# Altium footprint library connector.PcbLib: 189 footprints (part 1 of 12)
Each footprint in its own frame and in the unit in brackets; x right, y up, seen from the top. Pads: shape width x height; smd on the part's side, far side on the other; paste and mask are expansions set on the pad; w line width, h text height; cw(c..) or ccw(c..) is an arc to the next point about the centre after c.
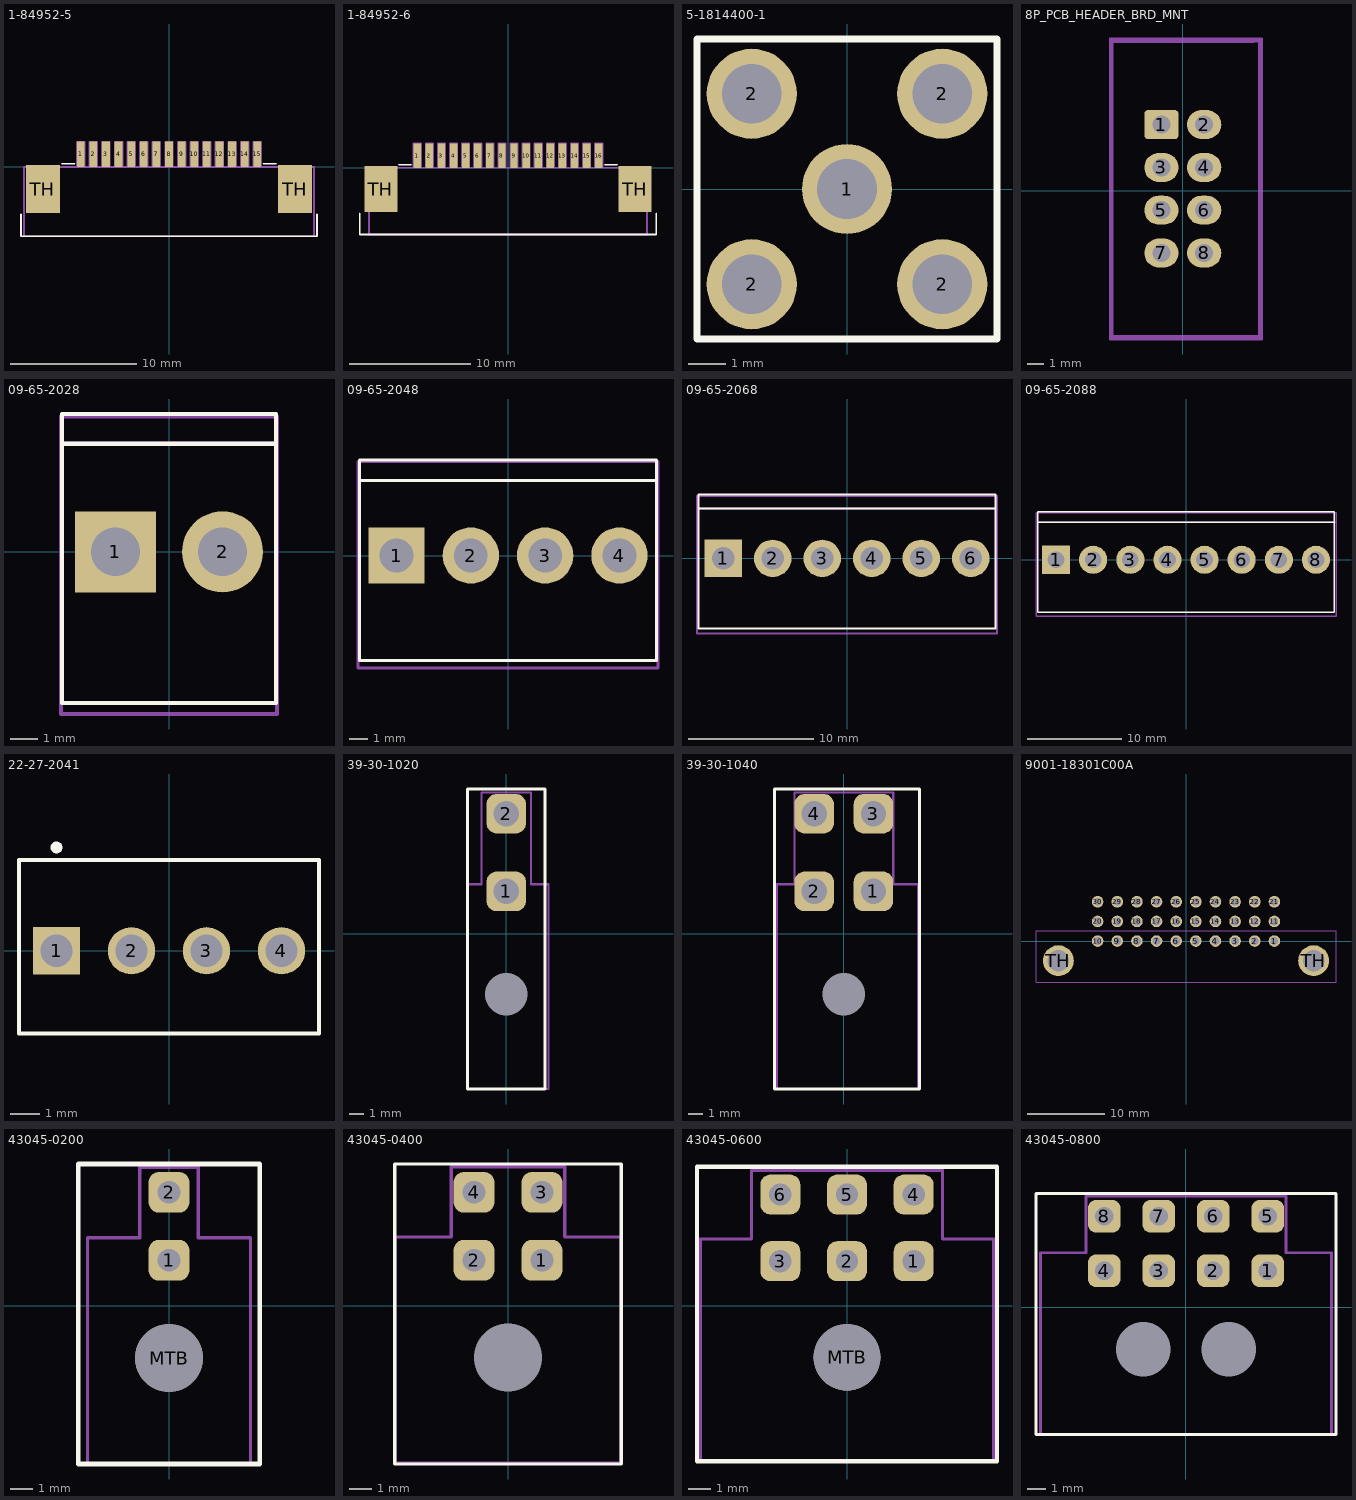
[diagram p0: the footprints below, top view; thin cyan lines are the x and y axes]

## 1-84952-5 [mm]
height 2.6
pads (17):
  rect 0.61x2 smd: 1(-7,1) 2(-6,1) 3(-5,1) 4(-4,1) 5(-3,1) 6(-2,1) 7(-1,1) 8(0,1) 9(1,1) 10(2,1) 11(3,1) 12(4,1) 13(5,1) 14(6,1) 15(7,1)
  rect 2.7x3.8 smd: TH(-10,-1.75) TH(10,-1.75)
Top Overlay:
  lines w0.15: -11.75,-3.75 -11.75,-5.5 0.5,-5.5 11.75,-5.5 11.75,-3.75 ; -8.5,0.25 -7.5,0.25 ; 7.5,0.25 8.5,0.25
Mechanical 29:
  lines w0.15: -7.3,0 -7.3,2 -6.7,2 -6.7,0 ; -6.3,0 -6.3,2 -5.7,2 -5.7,0 ; -5.3,0 -5.3,2 -4.7,2 -4.7,0 ; -4.3,0 -4.3,2 -3.7,2 -3.7,0 ; -3.3,0 -3.3,2 -2.7,2 -2.7,0 ; -2.3,0 -2.3,2 -1.7,2 -1.7,0 ; -1.3,0 -1.3,2 -0.7,2 -0.7,0 ; -0.3,0 -0.3,2 0.3,2 0.3,0 ; 0.7,0 0.7,2 1.3,2 1.3,0 ; 1.7,0 1.7,2 2.3,2 2.3,0 ; 2.7,0 2.7,2 3.3,2 3.3,0 ; 3.7,0 3.7,2 4.3,2 4.3,0 ; 4.7,0 4.7,2 5.3,2 5.3,0 ; 5.7,0 5.7,2 6.3,2 6.3,0 ; 6.7,0 6.7,2 7.3,2 7.3,0 ; -11.5,-5.5 11.5,-5.5 11.5,0 -11.5,0 -11.5,-5.5
  text ".Designator" at -3,-2.3 h1

## 1-84952-6 [mm]
height 2.6
pads (18):
  rect 0.61x2 smd: 1(-7.5,1) 2(-6.5,1) 3(-5.5,1) 4(-4.5,1) 5(-3.5,1) 6(-2.5,1) 7(-1.5,1) 8(-0.5,1) 9(0.5,1) 10(1.5,1) 11(2.5,1) 12(3.5,1) 13(4.5,1) 14(5.5,1) 15(6.5,1) 16(7.5,1)
  rect 2.7x3.8 smd: TH(-10.5,-1.75) TH(10.5,-1.75)
Top Overlay:
  lines w0.15: -12.25,-3.75 -12.25,-5.5 0.5,-5.5 12.25,-5.5 12.25,-3.75 ; -9,0.25 -8,0.25 ; 8,0.25 9,0.25
Mechanical 29:
  lines w0.15: -7.8,0 -7.8,2 -7.2,2 -7.2,0 ; -6.8,0 -6.8,2 -6.2,2 -6.2,0 ; -5.8,0 -5.8,2 -5.2,2 -5.2,0 ; -4.8,0 -4.8,2 -4.2,2 -4.2,0 ; -3.8,0 -3.8,2 -3.2,2 -3.2,0 ; -2.8,0 -2.8,2 -2.2,2 -2.2,0 ; -1.8,0 -1.8,2 -1.2,2 -1.2,0 ; -0.8,0 -0.8,2 -0.2,2 -0.2,0 ; 0.2,0 0.2,2 0.8,2 0.8,0 ; 1.2,0 1.2,2 1.8,2 1.8,0 ; 2.2,0 2.2,2 2.8,2 2.8,0 ; 3.2,0 3.2,2 3.8,2 3.8,0 ; 4.2,0 4.2,2 4.8,2 4.8,0 ; 5.2,0 5.2,2 5.8,2 5.8,0 ; 6.2,0 6.2,2 6.8,2 6.8,0 ; 7.2,0 7.2,2 7.8,2 7.8,0 ; -11.5,-5.5 -11.5,0 11.5,0 11.5,-5.5 -11.5,-5.5
  text ".Designator" at -2.5,-2.3 h1

## 5-1814400-1 [mm] "TE, SMA Connector Jack, Female Socket 50 Ohm Through Hole, Right Angle Solder"
height 10.43
pads (5):
  round 2.4 hole 1.6: 1(0,0) 2(-2.54,-2.54) 2(-2.54,2.54) 2(2.54,-2.54) 2(2.54,2.54)
Top Overlay:
  lines w0.2: -4,-4 4,-4 4,4 -4,4 -4,-4
3D body "c-5-1814400-1-d-3d.stp": height 10.43, standoff -3.1, extent -3.163,-11.05 3.164,3.15

## 8P_PCB_HEADER_BRD_MNT [mil] "HEADER BRD MNT 8POS 2.54MM"
height 393.7
pads (8):
  rrect25% 80x68 hole 42: 1(-50,155)
  oval 80x68 hole 42: 2(50,155) 3(-50,55) 4(50,55) 5(-50,-45) 6(50,-45) 7(-50,-145) 8(50,-145)
Mechanical 15:
  lines w5.91: -170,-346 -170,355 185,355 185,-346 -170,-346
Mechanical 29:
  circle w5.91: c-50,155 r21.83
  circle w5.91: c50,155 r21.83
  circle w5.91: c-50,55 r21.83
  circle w5.91: c50,55 r21.83
  circle w5.91: c50,-45 r21.83
  circle w5.91: c50,-145 r21.83
  circle w5.91: c-50,-145 r21.83
  circle w5.91: c-50,-45 r21.83
  circle w5.91: c-50,55 r21.83
  lines w5.91: -160,-340 165,-340 ; -160,349 165,349 ; -166.34,-339.57 179.13,-339.57 179.13,350.39 -166.34,350.39 -166.34,-339.57 ; -165,-340 -165,350 180,350 180,-340 -165,-340
  text ".Designator" at -118.11,263.78 h39.37
3D body "User Library-8 pin IDC shrouded header V2.step": height 361.42, standoff -116.93, extent -176.18,-344.09 186.02,355.91

## 09-65-2028 [mm]
pads (2):
  rect 3x3 hole 1.8: 1(-1.98,0)
  round 3 hole 1.8: 2(1.98,0)
Top Overlay:
  lines w0.15: -3.96,4 3.96,4 ; -3.96,-5.6 3.96,-5.6 3.96,5.1 -3.96,5.1 -3.96,-5.6
Mechanical 29:
  lines w0.15: -4,4 4,4 ; -4,-6 -4,5 4,5 4,-6 -4,-6
  text ".Designator" at -3.5,-0.3 h1
3D body "009652028.stp": height 13.85, standoff -3.6, extent -3.58,-5.6 3.58,5.15

## 09-65-2048 [mm]
height 12
pads (4):
  rect 3x3 hole 1.8: 1(-5.94,0)
  round 3 hole 1.8: 2(-1.98,0) 3(1.98,0) 4(5.94,0)
Top Overlay:
  lines w0.15: -7.92,4 7.92,4 ; -7.92,-5.6 7.92,-5.6 7.92,5.1 -7.92,5.1 -7.92,-5.6
Mechanical 29:
  lines w0.15: 8,4 -8,4 -8,5 ; -8,5 8,5 8,-6 -8,-6 -8,5
  text ".Designator" at -3.5,-0.8 h1
3D body "009652048.stp": height 13.85, standoff -3.6, extent -7.515,-5.6 7.565,5.15

## 09-65-2068 [mm]
pads (6):
  rect 3x3 hole 1.8: 1(-9.9,0)
  round 3 hole 1.8: 2(-5.94,0) 3(-1.98,0) 4(1.98,0) 5(5.94,0) 6(9.9,0)
Top Overlay:
  lines w0.15: -11.88,4 11.88,4 ; -11.88,-5.6 11.88,-5.6 11.88,5.1 -11.88,5.1 -11.88,-5.6
Mechanical 29:
  lines w0.15: 12,4 -12,4 -12,5 ; -12,5 12,5 12,-6 -12,-6 -12,5
  text ".Designator" at -3.5,-0.3 h1
3D body "009652068.stp": height 13.85, standoff -3.6, extent -11.5,-5.6 11.5,5.15

## 09-65-2088 [mm]
pads (8):
  rect 3x3 hole 1.8: 1(-13.86,0)
  round 3 hole 1.8: 2(-9.9,0) 3(-5.94,0) 4(-1.98,0) 5(1.98,0) 6(5.94,0) 7(9.9,0) 8(13.86,0)
Top Overlay:
  lines w0.15: -15.84,4 15.84,4 ; -15.84,-5.6 15.84,-5.6 15.84,5.1 -15.84,5.1 -15.84,-5.6
Mechanical 29:
  lines w0.15: 16,4 -16,4 -16,5 ; -16,5 16,5 16,-6 -16,-6 -16,5
  text ".Designator" at -2,0.2 h1
3D body "009652088.stp": height 13.85, standoff -3.6, extent -15.46,-5.6 15.46,5.15

## 22-27-2041 [mm]
pads (4):
  rect 1.6x1.6 hole 1.1: 1(-3.81,0)
  round 1.6 hole 1.1: 2(-1.27,0) 3(1.27,0) 4(3.81,0)
Top Overlay:
  circle w0.2: c-3.81,3.5 r0.1
  lines w0.15: -5.08,-2.8 5.08,-2.8 5.08,3.075 -5.08,3.075 -5.08,-2.8
3D body "022272041.stp": height 11.72, standoff -3.54, extent -5.105,-2.825 5.055,2.975

## 39-30-1020 [mm] "Mini-Fit Jr.� Header, Dual Row, Right Angle, with Snap-in Plastic Peg PCB Lock, 2 Circuits, PA Polyamide Nylon 6/6 94V-2, Tin (Sn) Plating"
height 9.6
pads (3):
  rrect50% 2.8x2.8 hole 1.8: 1(0,3) 2(0,8.5)
  round 0 hole 3 unplated: MTB(0,-4.3)
Top Overlay:
  lines w0.2: -2.75,-11 -2.75,10.25 2.75,10.25 2.75,-11 -2.75,-11
Top Courtyard:
  lines w0.15: -2.75,-11 -2.75,3.5 -1.75,3.5 -1.75,10 0,10 1.75,10 1.75,3.5 3,3.5 3,-11 0,-11 -2.75,-11
3D body "39-30-1020.stp": height 11.4, standoff -3.6, extent -2.75,-10.912 3.05,9.023

## 39-30-1040 [mm] "Mini-Fit Jr.� Header, Dual Row, Right Angle, with Snap-in Plastic Peg PCB Lock, 4 Circuits, PA Polyamide Nylon 6/6 94V-2, Tin (Sn) Plating"
height 9.6
pads (5):
  rrect50% 2.8x2.8 hole 1.8: 1(2.1,3) 2(-2.1,3) 3(2.1,8.5) 4(-2.1,8.5)
  round 0 hole 3 unplated: MTB(0,-4.3)
Top Overlay:
  lines w0.2: -4.9,-11 5.35,-11 5.35,10.25 -4.9,10.25 -4.9,-11
Top Courtyard:
  lines w0.15: -4.75,-11 0,-11 5.25,-11 5.25,3.5 3.5,3.5 3.5,10 0,10 -3.5,10 -3.5,3.5 -4.75,3.5 -4.75,-11
3D body "039301040.stp": height 11.4, standoff -3.6, extent -4.8,-10.9 5.2,9.035

## 9001-18301C00A [mm]
height 9
pads (32):
  round 1.5 hole 1: 1(11.43,0) 2(8.89,0) 3(6.35,0) 4(3.81,0) 5(1.27,0) 6(-1.27,0) 7(-3.81,0) 8(-6.35,0) 9(-8.89,0) 10(-11.43,0) 11(11.43,2.54) 12(8.89,2.54) 13(6.35,2.54) 14(3.81,2.54) 15(1.27,2.54) 16(-1.27,2.54) 17(-3.81,2.54) 18(-6.35,2.54) 19(-8.89,2.54) 20(-11.43,2.54) 21(11.43,5.08) 22(8.89,5.08) 23(6.35,5.08) 24(3.81,5.08) 25(1.27,5.08) 26(-1.27,5.08) 27(-3.81,5.08) 28(-6.35,5.08) 29(-8.89,5.08) 30(-11.43,5.08)
  round 4 hole 2.8: TH(-16.51,-2.54) TH(16.51,-2.54)
Mechanical 29:
  lines w0.15: -19.4,-5.3 -19.4,1.3 19.4,1.3 19.4,-5.3 -19.4,-5.3
  text ".Designator" at -5.5,-2.8 h1
3D body "0925_DIN_Type_3C_angled_male_30_pole.stp": height 9.35, standoff -3, extent -19.35,-12.639 19.35,5.38

## 43045-0200 [mm] "Molex, Micro-Fit 3.0� Right Angle Header, 3.00mm Pitch, Dual Row, 2 Circuits, with Snap-in Plastic Peg PCB Lock, Tin, Glow Wire Capable, Black"
height 8.77
pads (3):
  rrect50% 1.8x1.8 hole 1: 1(0,2) 2(0,5)
  round 3 hole 3 unplated: MTB(0,-2.32)
Top Overlay:
  lines w0.2: -4,-7 4,-7 4,6.25 -4,6.25 -4,-7
Top Courtyard:
  lines w0.15: -3.6,-7 -3.6,3 -1.3,3 -1.3,6.1 0,6.1 1.3,6.1 1.3,3 3.6,3 3.6,-7 0,-7 -3.6,-7
3D body "430450200.stp": height 8.77, standoff -3.18, extent -3.575,-6.92 3.575,5.32

## 43045-0400 [mm] "Molex, Micro-Fit 3.0� Right Angle Header, 3.00mm Pitch, Dual Row, 4 Circuits, with Snap-in Plastic Peg PCB Lock, Tin, Glow Wire Capable, Black"
height 8.77
pads (5):
  rrect50% 1.8x1.8 hole 1: 1(1.5,2) 2(-1.5,2) 3(1.5,5) 4(-1.5,5)
  round 0 hole 3 unplated: MTB(0,-2.3)
Top Overlay:
  lines w0.15: -5,-7 -5,6.25 5,6.25 5,-7 -5,-7
Top Courtyard:
  lines w0.15: -5,-6.975 0,-6.975 5,-6.975 5,3.025 2.5,3.025 2.5,6.125 0,6.125 -2.5,6.125 -2.5,3.025 -5,3.025 -5,-6.975
3D body "430450400.stp": height 8.77, standoff -3.18, extent -5.075,-6.92 5.075,5.32

## 43045-0600 [mm] "Molex, Micro-Fit 3.0� Right Angle Header, 3.00mm Pitch, Dual Row, 6 Circuits, with Snap-in Plastic Peg PCB Lock, Tin, Glow Wire Capable, Black"
height 8.77
pads (7):
  rrect50% 1.8x1.8 hole 1: 1(3,2) 2(0,2) 3(-3,2) 4(3,5) 5(0,5) 6(-3,5)
  round 3 hole 3 unplated: MTB(0,-2.325)
Top Overlay:
  lines w0.2: -6.75,-7 -6.75,6.25 6.75,6.25 6.75,-7 -6.75,-7
Top Courtyard:
  lines w0.15: -6.6,-7 0,-7 6.6,-7 6.6,3 4.3,3 4.3,6.1 0,6.1 -4.3,6.1 -4.3,3 -6.6,3 -6.6,-7
3D body "430450600.stp": height 8.77, standoff -3.18, extent -6.575,-6.92 6.575,5.32

## 43045-0800 [mm] "Molex, Micro-Fit 3.0� Right Angle Header, 3.00mm Pitch, Dual Row, 8 Circuits, with Snap-in Plastic Peg PCB Lock, Tin, Glow Wire Capable, Black"
height 8.77
pads (10):
  rrect50% 1.8x1.8 hole 1: 1(4.5,2) 2(1.5,2) 3(-1.5,2) 4(-4.5,2) 5(4.5,5) 6(1.5,5) 7(-1.5,5) 8(-4.5,5)
  round 0 hole 3 unplated: MTB(-2.34,-2.32) MTB(2.34,-2.32)
Top Overlay:
  lines w0.15: -8.25,-7 -8.25,6.25 8.25,6.25 8.25,-7 -8.25,-7
Top Courtyard:
  lines w0.15: -8,-7 -8,3 -5.5,3 -5.5,6.1 0,6.1 5.5,6.1 5.5,3 8,3 8,-7 0,-7 -8,-7
3D body "430450800.stp": height 8.77, standoff -3.18, extent -8.075,-6.92 8.075,5.32